# Altium footprint library PcbLib1.PcbLib: 6 footprints
Each footprint in its own frame and in the unit in brackets; x right, y up, seen from the top. Pads: shape width x height; smd on the part's side, far side on the other; paste and mask are expansions set on the pad; w line width, h text height; cw(c..) or ccw(c..) is an arc to the next point about the centre after c.
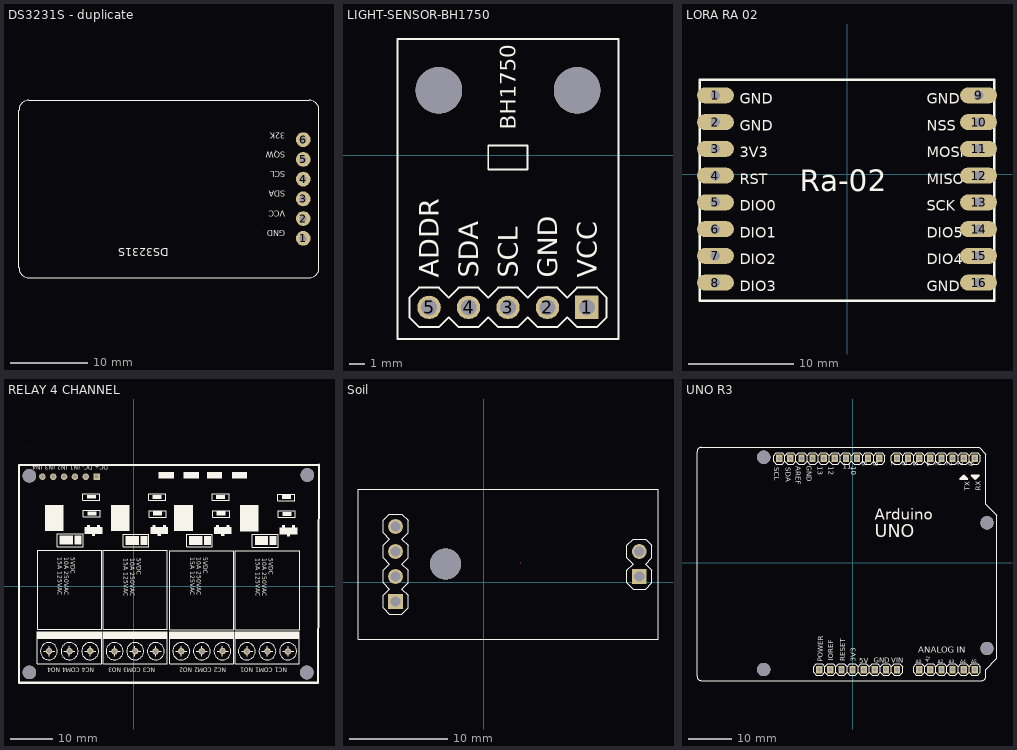
[diagram p0: the footprints below, top view; thin cyan lines are the x and y axes]

## DS3231S - duplicate [mil]
pads (6):
  round 74.8 hole 35.43 paste+0 mask+4: 1(48430,35305) 2(48430,35405) 3(48430,35505) 4(48430,35605) 5(48430,35705) 6(48430,35805)
Top Overlay:
  lines w6: 48460,35105 ccw(c48460,35155) 48510,35155 48510,35955 ccw(c48460,35955) 48460,36005 ; 48460.04,35105 47040,35105 cw(c47040,35155) 46990,35155 46990,35955 cw(c47040,35955) 47040,36005 48460.04,36005
  text "32K" at 48339.96,35840 h30
  text "SQW" at 48339.94,35744.97 h30
  text "GND" at 48339.94,35344.97 h30
  text "VCC" at 48339.94,35444.97 h30
  text "SCL" at 48339.94,35644.97 h30
  text "SDA" at 48339.94,35544.97 h30
  text "DS3231S" at 47750,35255 h40
Mechanical 15:
  lines w0.1: 48230.49,35362.99 48230.51,35363.01
3D body "DS3231 Timer Assembly.stp": height 314.96, standoff -379.13, extent 46970.56,35135.87 48480,35994.13

## LIGHT-SENSOR-BH1750 [mil]
pads (7):
  rect 59.37x59.37 hole 39.36 paste+0 mask+2: 1(-2105,-385)
  round 59.37 hole 39.36 paste+0 mask+2: 2(-2205,-385) 3(-2305,-385) 4(-2405,-385) 5(-2505,-385)
  round 118.1 hole 118.1 unplated paste+0: ""(-2480,165) ""(-2130,165)
Top Overlay:
  lines w5: -2585,-465 -2025,-465 -2025,295 -2585,295 -2585,-465 ; -2555,-410 -2555,-360 -2530,-335 -2480,-335 -2455,-360 -2430,-335 -2380,-335 -2355,-360 -2330,-335 -2280,-335 -2255,-360 -2230,-335 -2180,-335 -2155,-360 -2130,-335 -2080,-335 -2055,-360 -2055,-410 -2080,-435 -2130,-435 -2155,-410 -2180,-435 -2230,-435 -2255,-410 -2280,-435 -2330,-435 -2355,-410 -2380,-435 -2430,-435 -2455,-410 -2480,-435 -2530,-435 -2555,-410 ; -2355,-35 -2255,-35 -2255,25 -2355,25 -2355,-35
  text "SCL" at -2280,-310 h50
  text "GND" at -2180,-310 h50
  text "BH1750" at -2285,65 h40
  text "VCC" at -2080,-310 h50
  text "ADDR" at -2480,-310 h50
  text "SDA" at -2380,-310 h50
3D body "BH1750_with_connector.STEP": height 134.9, standoff -324.66, extent -2570,-418.8 -2015.18,320

## LORA RA 02 [mil]
pads (16):
  oval 137.79x60 hole 36 paste+0 mask+4: 1(-492.12,294.32) 2(-492.12,194.32) 3(-492.12,94.33) 4(-492.12,-5.67) 5(-492.12,-105.67) 6(-492.12,-205.68) 7(-492.12,-305.68) 8(-492.12,-405.68) 9(492.12,294.32) 10(492.12,194.32) 11(492.12,94.33) 12(492.12,-5.67) 13(492.12,-105.67) 14(492.12,-205.68) 15(492.12,-305.68) 16(492.12,-405.68)
Top Overlay:
  lines w10: -551.18,-473.38 -551.18,353.38 551.17,353.38 551.17,-473.38 -551.18,-473.38
  text "DIO3" at -401.24,-437.76 h39.37
  text "DIO2" at -401.24,-337.76 h39.37
  text "DIO1" at -401.24,-237.76 h39.37
  text "DIO0" at -401.24,-137.76 h39.37
  text "DIO4" at 298.76,-337.76 h39.37
  text "DIO5" at 298.76,-237.76 h39.37
  text "SCK" at 298.76,-137.76 h39.37
  text "MISO" at 298.76,-37.76 h39.37
  text "NSS" at 298.76,162.24 h39.37
  text "MOSI" at 298.76,62.24 h39.37
  text "RST" at -401.24,-37.76 h39.37
  text "3V3" at -401.13,62.27 h39.37
  text "GND" at -401.24,162.24 h39.37
  text "GND" at 298.76,262.24 h39.37
  text "GND" at 298.76,-437.76 h39.37
  text "GND" at -401.24,262.24 h39.37
  text "Ra-02" at -177.19,-64.86 h80
Mechanical 15:
  lines w0.1: 556.01,-31.62 556.03,-31.61
3D body "LoRa-Ra-02.step": height 196.85, standoff 0, extent -467.76,-425 437.76,283.66
3D body "Stiftleiste.step": height 232.28, standoff -200.79, extent 436.57,-457.15 535,347.15
3D body "Stiftleiste.step": height 232.28, standoff -200.79, extent -553.43,-460 -455,344.29

## RELAY 4 CHANNEL [mil]
pads (22):
  rect 60x60 hole 36 paste+0 mask+2: 1(-343.72,1012.05)
  round 60 hole 36 paste+0 mask+2: 2(-443.73,1012.05) 3(-543.73,1012.05) 4(-643.73,1012.05) 5(-743.73,1012.05) 6(-843.73,1012.05) 11(626.27,-597.94) 12(436.27,-597.94) 17(-593.18,-596.84) 18(-783.18,-596.84)
  round 60 hole 36 paste+0 mask+4: 7(1419.46,-599.79) 8(1231.27,-597.94) 9(1041.51,-599.79) 10(817.1,-595.85) 13(200.01,-598.69) 14(11.82,-596.84) 15(-177.94,-598.69) 16(-402.35,-594.75)
  round 125.98 hole 125.98 unplated paste+0: ""(-963.71,-791.98) ""(-963.71,1019.04) ""(1594.32,-793.08) ""(1599.32,1026.92)
Top Overlay:
  drawing of 167 lines, arcs and shapes, not listed
  text "NC3 COM3 NO3" at 195.64,-748.74 h40
  text "NC4 COM4 NO4" at -367.35,-748.74 h40
  text "DC+ DC- IN1 IN2 IN3 IN4" at -238.73,1117.05 h40
  text "5VDC / 10A 250VAC / 15A 125VAC" at -95.58,259.57 h40
  text "5VDC / 10A 250VAC / 15A 125VAC" at -701.88,271.38 h40
  text "5VDC / 10A 250VAC / 15A 125VAC" at 517.57,270.28 h40
  text "5VDC / 10A 250VAC / 15A 125VAC" at 1123.87,258.47 h40
  text "NC2 COM2 NO2" at 852.1,-749.84 h40
  text "NC1 COM1 NO1" at 1415.09,-749.84 h40
Mechanical 15:
  lines w0.1: -956.4,1301.89 -956.38,1301.91
3D body "Relay Module - 4 channel.step": height 647.66, standoff -82.74, extent -1164.24,-867.94 1788.52,1100.56

## Soil [mil]
pads (7):
  rect 59.37x59.37 hole 39.36 paste+0 mask+2: J1.1(-352.5,-77.5) J2.1(622.5,22.5)
  round 59.37 hole 39.36 paste+0 mask+2: J1.2(-352.5,22.5) J1.3(-352.5,122.5) J1.4(-352.5,222.5) J2.2(622.5,122.5)
  round 125.98 hole 125.98 unplated paste+0: ""(-152.5,72.5)
Top Overlay:
  lines w5: -502.5,-227.5 697.5,-227.5 697.5,372.5 -502.5,372.5 -502.5,-227.5 ; -402.5,-102.5 -377.5,-127.5 -327.5,-127.5 -302.5,-102.5 -302.5,-52.5 -327.5,-27.5 -302.5,-2.5 -302.5,47.5 -327.5,72.5 -302.5,97.5 -302.5,147.5 -327.5,172.5 -302.5,197.5 -302.5,247.5 -327.5,272.5 -377.5,272.5 -402.5,247.5 -402.5,197.5 -377.5,172.5 -402.5,147.5 -402.5,97.5 -377.5,72.5 -402.5,47.5 -402.5,-2.5 -377.5,-27.5 -402.5,-52.5 -402.5,-102.5 ; 572.5,-2.5 597.5,-27.5 647.5,-27.5 672.5,-2.5 672.5,47.5 647.5,72.5 672.5,97.5 672.5,147.5 647.5,172.5 597.5,172.5 572.5,147.5 572.5,97.5 597.5,72.5 572.5,47.5 572.5,-2.5
Mechanical 15:
  lines w0.1: 147.49,77.49 147.51,77.51
3D body "soil moisture sensor.step": height 48.74, standoff -258.45, extent 675,-308.86 3223.54,458.86
3D body "Soil Moisture Sensor Board.step": height 48.11, standoff -259.08, extent -802.33,-204.53 973.83,354.53

## UNO R3 [mil]
pads (36):
  rect 56x67.2 hole 33.4 paste+0 mask+2: 1(240,939.99) 2(140,939.99) 3(40,939.99) 4(-60,939.99) 5(-160,939.99) 6(-260,939.99) 7(-360,939.99) 8(-460,939.99) 9(-560,939.99) 10(-660,939.99) 11(1100,939.99) 12(1000,939.99) 13(900,939.99) 14(800,939.99) 15(700,939.99) 16(600,939.99) 17(500,939.99) 18(400,939.99) 19(600,-960) 20(700,-960) 21(800,-960) 22(900,-960) 23(1000,-960) 24(1100,-960) 25(-300,-960) 26(-200,-960) 27(-100,-960) 28(0,-960) 29(100,-960) 30(200,-960) 31(300,-960) 32(400,-960)
  round 120 hole 120 unplated paste+0: ""(-800,-960) ""(-800,950) ""(1210,-770) ""(1210,360)
Top Overlay:
  drawing of 255 lines, arcs and shapes, not listed
  text "5V" at 60,-903 h46
  text "A0" at 568,-905 h30
  text "ANALOG IN" at 590,-808 h56
  text "Arduino" at 200,390 h100
  text "AREF" at -513,870 h46
  text "GND" at -412,875 h46
  text "TX" at 1053,650 h46
  text "RX" at 1153,650 h46
  text "UNO" at 200,232.5 h115
  text "RESET" at -67,-885 h46
  text "3V3" at 28.1,-889.6 h46
  text "A1" at 682,-895.37 h30
  text "A2" at 768,-905 h30
  text "A3" at 868,-905 h30
  text "A4" at 968,-905 h30
  text "A5" at 1068,-905 h30
  text "VIN" at 350,-898.1 h46
  text "GND" at 190,-898.1 h46
  text "13" at -313,870 h46
  text "12" at -213,870 h46
  text "11" at -90,847 h46
  text "10" at -13,870 h46
  text "9" at 132.91,872 h46
  text "8" at 233,870 h46
  text "7" at 393,870 h46
  text "6" at 492.91,872 h46
  text "5" at 593,870 h46
  text "4" at 688.61,856.48 h46
  text "3" at 793,870 h46
  text "2" at 893,870 h46
  text "1" at 993,870 h46
  text "0" at 1093,870 h46
  text "IOREF" at -171.9,-882.3 h46
  text "SDA" at -603,860 h46
  text "SCL" at -703,860 h46
  text "POWER" at -268.2,-890.4 h46
Mechanical 15:
  lines w0.1: -35.01,-5.01 -34.99,-4.99
3D body "ARDUINO-UNO_20.stp": height 485.04, standoff -113.39, extent -1650.2,-1055.79 1300.2,1045